# Altium footprint library Package_DFN_QFN.PcbLib: 557 footprints (part 27 of 35)
Each footprint in its own frame and in the unit in brackets; x right, y up, seen from the top. Pads: shape width x height; smd on the part's side, far side on the other; paste and mask are expansions set on the pad; w line width, h text height; cw(c..) or ccw(c..) is an arc to the next point about the centre after c.
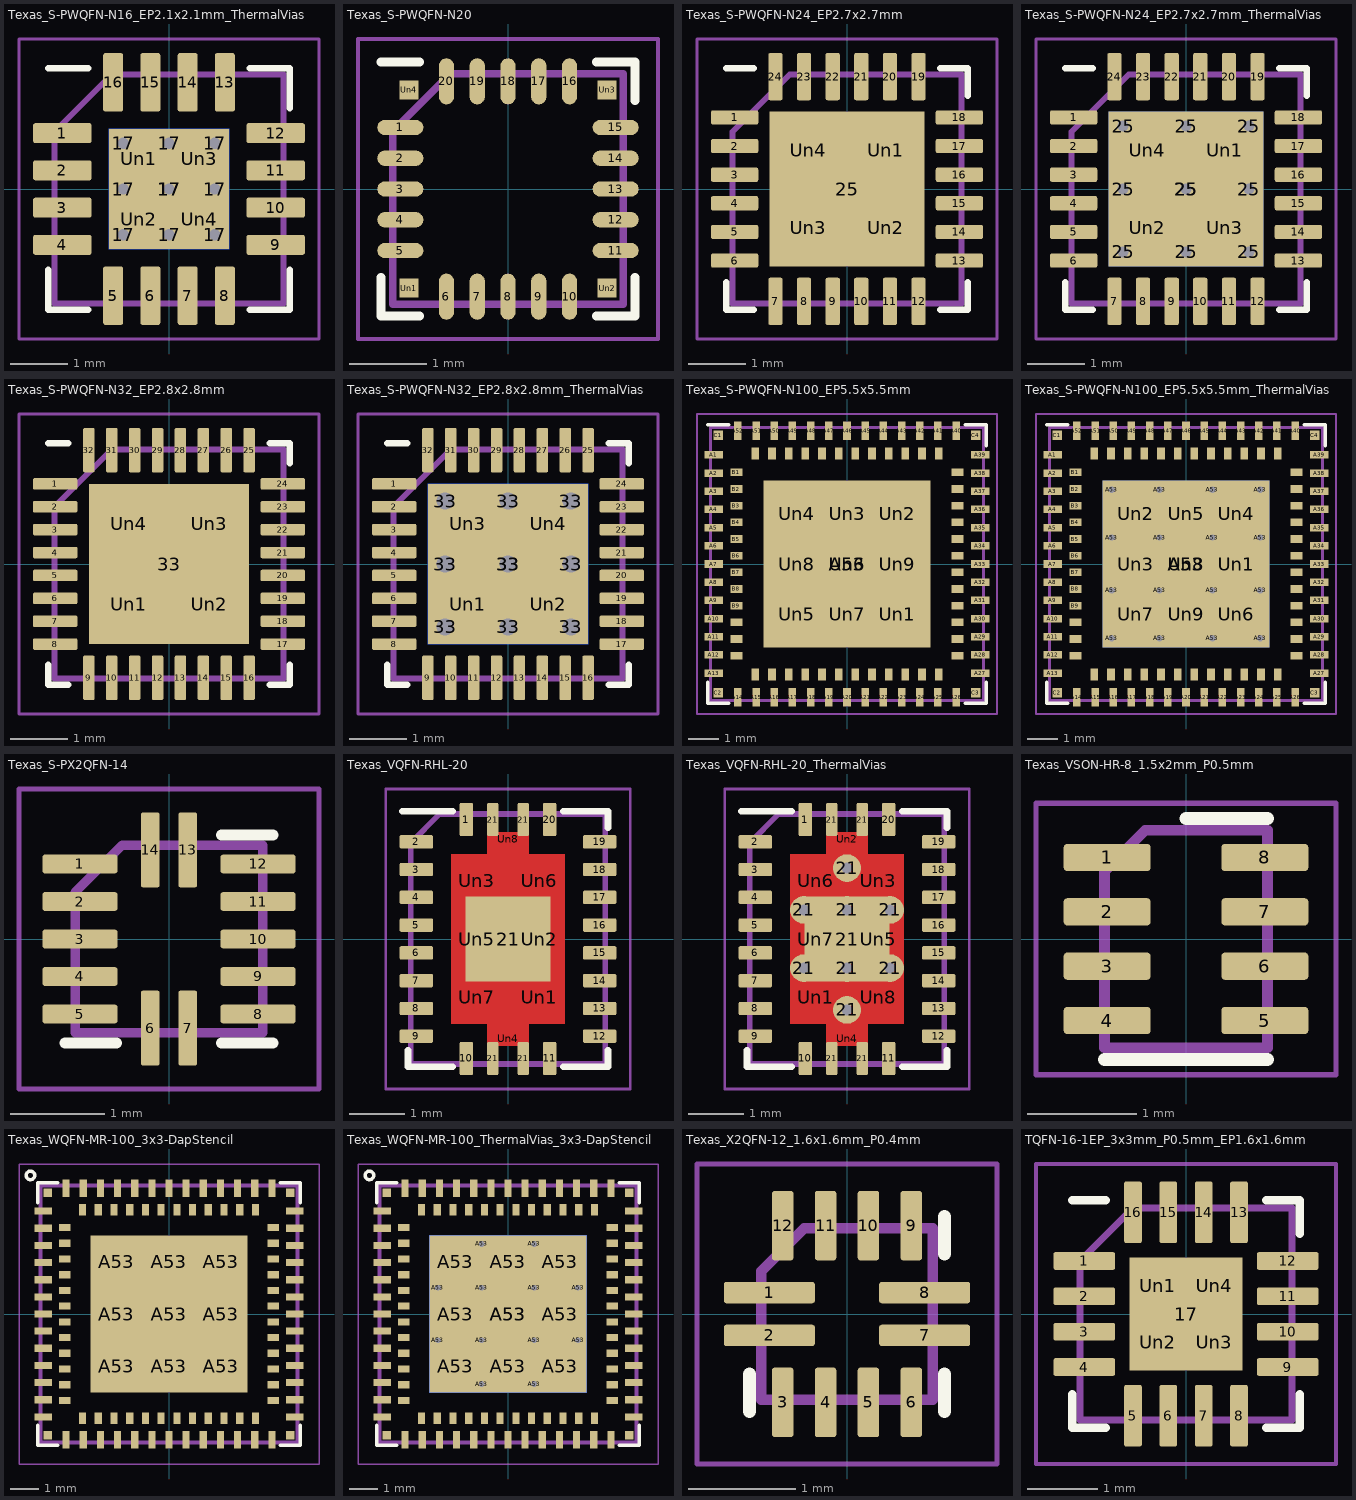
[diagram p26: the footprints below, top view; thin cyan lines are the x and y axes]

## Texas_S-PWQFN-N16_EP2.1x2.1mm_ThermalVias [mm]
pads (31):
  rrect25% 1.025x0.35 smd: 1(-1.863,0.975) 2(-1.863,0.325) 3(-1.863,-0.325) 4(-1.863,-0.975) 9(1.863,-0.975) 10(1.863,-0.325) 11(1.863,0.325) 12(1.863,0.975)
  rrect25% 0.35x1.025 smd: 5(-0.975,-1.863) 6(-0.325,-1.863) 7(0.325,-1.863) 8(0.975,-1.863) 13(0.975,1.863) 14(0.325,1.863) 15(-0.325,1.863) 16(-0.975,1.863)
  round 0.5 hole 0.2: 17(-0.8,-0.8) 17(-0.8,0) 17(-0.8,0.8) 17(0,-0.8) 17(0,0) 17(0,0.8) 17(0.8,-0.8) 17(0.8,0) 17(0.8,0.8)
  rect 2.1x2.1 smd far side: 17(0,0)
  rect 2.1x2.1 smd: 17(0,0)
  rrect25% 0.88x0.88 on Top Paste: Un1(-0.525,0.525) Un2(-0.525,-0.525) Un3(0.525,0.525) Un4(0.525,-0.525)
F.SilkS:
  lines w0.12: -2.11,-1.41 -2.11,-2.11 -1.41,-2.11 ; -2.11,2.11 -1.41,2.11 ; 1.41,-2.11 2.11,-2.11 2.11,-1.41 ; 1.41,2.11 2.11,2.11 2.11,1.41
F.CrtYd:
  lines w0.05: -2.62,-2.62 2.62,-2.62 2.62,2.62 -2.62,2.62 -2.62,-2.62
F.Fab:
  lines w0.1: -2,-2 -2,1 -1,2 2,2 2,-2 -2,-2
  text "'.Designator'" at -4.047,-0.84 h1

## Texas_S-PWQFN-N20 [mm]
pads (24):
  rrect100% 0.6x0.2 smd: 1(-1.4,0.8) 2(-1.4,0.4) 3(-1.4,0) 4(-1.4,-0.4) 5(-1.4,-0.8) 11(1.4,-0.8) 12(1.4,-0.4) 13(1.4,0) 14(1.4,0.4) 15(1.4,0.8)
  rrect100% 0.2x0.6 smd: 6(-0.8,-1.4) 7(-0.4,-1.4) 8(0,-1.4) 9(0.4,-1.4) 10(0.8,-1.4) 16(0.8,1.4) 17(0.4,1.4) 18(0,1.4) 19(-0.4,1.4) 20(-0.8,1.4)
  rect 0.25x0.25 smd: Un1(-1.288,-1.288) Un2(1.288,-1.288) Un3(1.288,1.288) Un4(-1.288,1.288)
F.SilkS:
  lines w0.12: -1.65,-1.15 -1.65,-1.65 -1.15,-1.65 ; -1.65,1.65 -1.15,1.65 ; 1.15,-1.65 1.65,-1.65 1.65,-1.15 ; 1.15,1.65 1.65,1.65 1.65,1.15
F.CrtYd:
  lines w0.05: -1.95,-1.95 -1.95,1.95 1.95,1.95 1.95,-1.95 -1.95,-1.95
F.Fab:
  lines w0.1: -1.5,-1.5 -1.5,0.75 -0.75,1.5 1.5,1.5 1.5,-1.5 -1.5,-1.5
  text "'.Designator'" at -2.023,-0.42 h0.5

## Texas_S-PWQFN-N24_EP2.7x2.7mm [mm]
pads (29):
  rrect25% 0.825x0.25 smd: 1(-1.963,1.25) 2(-1.963,0.75) 3(-1.963,0.25) 4(-1.963,-0.25) 5(-1.963,-0.75) 6(-1.963,-1.25) 13(1.963,-1.25) 14(1.963,-0.75) 15(1.963,-0.25) 16(1.963,0.25) 17(1.963,0.75) 18(1.963,1.25)
  rrect25% 0.25x0.825 smd: 7(-1.25,-1.963) 8(-0.75,-1.963) 9(-0.25,-1.963) 10(0.25,-1.963) 11(0.75,-1.963) 12(1.25,-1.963) 19(1.25,1.963) 20(0.75,1.963) 21(0.25,1.963) 22(-0.25,1.963) 23(-0.75,1.963) 24(-1.25,1.963)
  rect 2.7x2.7 smd: 25(0,0)
  rrect23% 1.09x1.09 on Top Paste: Un1(0.675,0.675) Un2(0.675,-0.675) Un3(-0.675,-0.675) Un4(-0.675,0.675)
F.SilkS:
  lines w0.12: -2.11,-1.635 -2.11,-2.11 -1.635,-2.11 ; -2.11,2.11 -1.635,2.11 ; 1.635,-2.11 2.11,-2.11 2.11,-1.635 ; 1.635,2.11 2.11,2.11 2.11,1.635
F.CrtYd:
  lines w0.05: -2.62,-2.62 2.62,-2.62 2.62,2.62 -2.62,2.62 -2.62,-2.62
F.Fab:
  lines w0.1: -2,-2 -2,1 -1,2 2,2 2,-2 -2,-2
  text "'.Designator'" at -4.047,-0.84 h1

## Texas_S-PWQFN-N24_EP2.7x2.7mm_ThermalVias [mm]
pads (39):
  rrect25% 0.825x0.25 smd: 1(-1.963,1.25) 2(-1.963,0.75) 3(-1.963,0.25) 4(-1.963,-0.25) 5(-1.963,-0.75) 6(-1.963,-1.25) 13(1.963,-1.25) 14(1.963,-0.75) 15(1.963,-0.25) 16(1.963,0.25) 17(1.963,0.75) 18(1.963,1.25)
  rrect25% 0.25x0.825 smd: 7(-1.25,-1.963) 8(-0.75,-1.963) 9(-0.25,-1.963) 10(0.25,-1.963) 11(0.75,-1.963) 12(1.25,-1.963) 19(1.25,1.963) 20(0.75,1.963) 21(0.25,1.963) 22(-0.25,1.963) 23(-0.75,1.963) 24(-1.25,1.963)
  round 0.5 hole 0.2: 25(-1.1,-1.1) 25(-1.1,0) 25(-1.1,1.1) 25(0,-1.1) 25(0,0) 25(0,1.1) 25(1.1,-1.1) 25(1.1,0) 25(1.1,1.1)
  rect 2.7x2.7 smd far side: 25(0,0)
  rect 2.7x2.7 smd: 25(0,0)
  rrect22% 1.13x1.13 on Top Paste: Un1(0.675,0.675) Un2(-0.675,-0.675) Un3(0.675,-0.675) Un4(-0.675,0.675)
F.SilkS:
  lines w0.12: -2.11,-1.635 -2.11,-2.11 -1.635,-2.11 ; -2.11,2.11 -1.635,2.11 ; 1.635,-2.11 2.11,-2.11 2.11,-1.635 ; 1.635,2.11 2.11,2.11 2.11,1.635
F.CrtYd:
  lines w0.05: -2.62,-2.62 2.62,-2.62 2.62,2.62 -2.62,2.62 -2.62,-2.62
F.Fab:
  lines w0.1: -2,-2 -2,1 -1,2 2,2 2,-2 -2,-2
  text "'.Designator'" at -4.047,-0.84 h1

## Texas_S-PWQFN-N32_EP2.8x2.8mm [mm]
pads (37):
  rrect25% 0.775x0.2 smd: 1(-1.987,1.4) 2(-1.987,1) 3(-1.987,0.6) 4(-1.987,0.2) 5(-1.987,-0.2) 6(-1.987,-0.6) 7(-1.987,-1) 8(-1.987,-1.4) 17(1.987,-1.4) 18(1.987,-1) 19(1.987,-0.6) 20(1.987,-0.2) 21(1.987,0.2) 22(1.987,0.6) 23(1.987,1) 24(1.987,1.4)
  rrect25% 0.2x0.775 smd: 9(-1.4,-1.987) 10(-1,-1.987) 11(-0.6,-1.987) 12(-0.2,-1.987) 13(0.2,-1.987) 14(0.6,-1.987) 15(1,-1.987) 16(1.4,-1.987) 25(1.4,1.987) 26(1,1.987) 27(0.6,1.987) 28(0.2,1.987) 29(-0.2,1.987) 30(-0.6,1.987) 31(-1,1.987) 32(-1.4,1.987)
  rect 2.8x2.8 smd: 33(0,0)
  rrect22% 1.13x1.13 on Top Paste: Un1(-0.7,-0.7) Un2(0.7,-0.7) Un3(0.7,0.7) Un4(-0.7,0.7)
F.SilkS:
  lines w0.12: -2.11,-1.76 -2.11,-2.11 -1.76,-2.11 ; -2.11,2.11 -1.76,2.11 ; 1.76,-2.11 2.11,-2.11 2.11,-1.76 ; 1.76,2.11 2.11,2.11 2.11,1.76
F.CrtYd:
  lines w0.05: -2.62,-2.62 -2.62,2.62 2.62,2.62 2.62,-2.62 -2.62,-2.62
F.Fab:
  lines w0.1: -2,-2 2,-2 2,2 -1,2 -2,1 -2,-2
  text "'.Designator'" at -4.047,-0.84 h1

## Texas_S-PWQFN-N32_EP2.8x2.8mm_ThermalVias [mm]
pads (47):
  rrect25% 0.775x0.2 smd: 1(-1.987,1.4) 2(-1.987,1) 3(-1.987,0.6) 4(-1.987,0.2) 5(-1.987,-0.2) 6(-1.987,-0.6) 7(-1.987,-1) 8(-1.987,-1.4) 17(1.987,-1.4) 18(1.987,-1) 19(1.987,-0.6) 20(1.987,-0.2) 21(1.987,0.2) 22(1.987,0.6) 23(1.987,1) 24(1.987,1.4)
  rrect25% 0.2x0.775 smd: 9(-1.4,-1.987) 10(-1,-1.987) 11(-0.6,-1.987) 12(-0.2,-1.987) 13(0.2,-1.987) 14(0.6,-1.987) 15(1,-1.987) 16(1.4,-1.987) 25(1.4,1.987) 26(1,1.987) 27(0.6,1.987) 28(0.2,1.987) 29(-0.2,1.987) 30(-0.6,1.987) 31(-1,1.987) 32(-1.4,1.987)
  round 0.6 hole 0.3: 33(-1.1,-1.1) 33(-1.1,0) 33(-1.1,1.1) 33(0,-1.1) 33(0,0) 33(0,1.1) 33(1.1,-1.1) 33(1.1,0) 33(1.1,1.1)
  rect 2.8x2.8 smd: 33(0,0)
  rect 2.8x2.8 smd far side: 33(0,0)
  rrect21% 1.17x1.17 on Top Paste: Un1(-0.7,-0.7) Un2(0.7,-0.7) Un3(-0.7,0.7) Un4(0.7,0.7)
F.SilkS:
  lines w0.12: -2.11,-1.76 -2.11,-2.11 -1.76,-2.11 ; -2.11,2.11 -1.76,2.11 ; 1.76,-2.11 2.11,-2.11 2.11,-1.76 ; 1.76,2.11 2.11,2.11 2.11,1.76
F.CrtYd:
  lines w0.05: -2.62,-2.62 -2.62,2.62 2.62,2.62 2.62,-2.62 -2.62,-2.62
F.Fab:
  lines w0.1: -2,-2 -2,1 -1,2 2,2 2,-2 -2,-2
  text "'.Designator'" at -4.047,-0.84 h1

## Texas_S-PWQFN-N100_EP5.5x5.5mm [mm]
pads (114):
  rect 0.6x0.25 smd: A1(-4.4,3.6) A2(-4.4,3) A3(-4.4,2.4) A4(-4.4,1.8) A5(-4.4,1.2) A6(-4.4,0.6) A7(-4.4,0) A8(-4.4,-0.6) A9(-4.4,-1.2) A10(-4.4,-1.8) A11(-4.4,-2.4) A12(-4.4,-3) A13(-4.4,-3.6) A27(4.4,-3.6) A28(4.4,-3) A29(4.4,-2.4) A30(4.4,-1.8) A31(4.4,-1.2) A32(4.4,-0.6) A33(4.4,0) A34(4.4,0.6) A35(4.4,1.2) A36(4.4,1.8) A37(4.4,2.4) A38(4.4,3) A39(4.4,3.6)
  rect 0.25x0.6 smd: A14(-3.6,-4.4) A15(-3,-4.4) A16(-2.4,-4.4) A17(-1.8,-4.4) A18(-1.2,-4.4) A19(-0.6,-4.4) A20(0,-4.4) A21(0.6,-4.4) A22(1.2,-4.4) A23(1.8,-4.4) A24(2.4,-4.4) A25(3,-4.4) A26(3.6,-4.4) A40(3.6,4.4) A41(3,4.4) A42(2.4,4.4) A43(1.8,4.4) A44(1.2,4.4) A45(0.6,4.4) A46(0,4.4) A47(-0.6,4.4) A48(-1.2,4.4) A49(-1.8,4.4) A50(-2.4,4.4) A51(-3,4.4) A52(-3.6,4.4)
  rect 5.5x5.5 smd: A53(0,0)
  rect 0.4x0.25 smd: B1(-3.65,3.025) B2(-3.65,2.475) B3(-3.65,1.925) B4(-3.65,1.375) B5(-3.65,0.825) B6(-3.65,0.275) B7(-3.65,-0.275) B8(-3.65,-0.825) B9(-3.65,-1.375) B10(-3.65,-1.925) B11(-3.65,-2.475) B12(-3.65,-3.025) B25(3.65,-3.025) B26(3.65,-2.475) B27(3.65,-1.925) B28(3.65,-1.375) B29(3.65,-0.825) B30(3.65,-0.275) B31(3.65,0.275) B32(3.65,0.825) B33(3.65,1.375) B34(3.65,1.925) B35(3.65,2.475) B36(3.65,3.025)
  rect 0.25x0.4 smd: B13(-3.025,-3.65) B14(-2.475,-3.65) B15(-1.925,-3.65) B16(-1.375,-3.65) B17(-0.825,-3.65) B18(-0.275,-3.65) B19(0.275,-3.65) B20(0.825,-3.65) B21(1.375,-3.65) B22(1.925,-3.65) B23(2.475,-3.65) B24(3.025,-3.65) B37(3.025,3.65) B38(2.475,3.65) B39(1.925,3.65) B40(1.375,3.65) B41(0.825,3.65) B42(0.275,3.65) B43(-0.275,3.65) B44(-0.825,3.65) B45(-1.375,3.65) B46(-1.925,3.65) B47(-2.475,3.65) B48(-3.025,3.65)
  rect 0.3x0.3 smd: C1(-4.25,4.25) C2(-4.25,-4.25) C3(4.25,-4.25) C4(4.25,4.25)
  rect 1.5x1.5 on Top Paste: Un1(1.66,-1.66) Un2(1.66,1.66) Un3(0,1.66) Un4(-1.66,1.66) Un5(-1.66,-1.66) Un6(0,0) Un7(0,-1.66) Un8(-1.66,0) Un9(1.66,0)
F.SilkS:
  lines w0.12: -4.6,-3.9 -4.6,-4.6 -3.9,-4.6 ; -4.6,4.6 -3.9,4.6 ; 3.9,-4.6 4.6,-4.6 4.6,-3.9 ; 3.9,4.6 4.6,4.6 4.6,3.9
F.CrtYd:
  lines w0.05: -4.95,-4.95 -4.95,4.95 4.95,4.95 4.95,-4.95 -4.95,-4.95
F.Fab:
  lines w0.1: -4.5,-4.5 4.5,-4.5 4.5,4.5 -4.5,4.5 -4.5,-4.5
  text "'.Designator'" at -4.047,-0.84 h1

## Texas_S-PWQFN-N100_EP5.5x5.5mm_ThermalVias [mm]
pads (131):
  rect 0.6x0.25 smd: A1(-4.4,3.6) A2(-4.4,3) A3(-4.4,2.4) A4(-4.4,1.8) A5(-4.4,1.2) A6(-4.4,0.6) A7(-4.4,0) A8(-4.4,-0.6) A9(-4.4,-1.2) A10(-4.4,-1.8) A11(-4.4,-2.4) A12(-4.4,-3) A13(-4.4,-3.6) A27(4.4,-3.6) A28(4.4,-3) A29(4.4,-2.4) A30(4.4,-1.8) A31(4.4,-1.2) A32(4.4,-0.6) A33(4.4,0) A34(4.4,0.6) A35(4.4,1.2) A36(4.4,1.8) A37(4.4,2.4) A38(4.4,3) A39(4.4,3.6)
  rect 0.25x0.6 smd: A14(-3.6,-4.4) A15(-3,-4.4) A16(-2.4,-4.4) A17(-1.8,-4.4) A18(-1.2,-4.4) A19(-0.6,-4.4) A20(0,-4.4) A21(0.6,-4.4) A22(1.2,-4.4) A23(1.8,-4.4) A24(2.4,-4.4) A25(3,-4.4) A26(3.6,-4.4) A40(3.6,4.4) A41(3,4.4) A42(2.4,4.4) A43(1.8,4.4) A44(1.2,4.4) A45(0.6,4.4) A46(0,4.4) A47(-0.6,4.4) A48(-1.2,4.4) A49(-1.8,4.4) A50(-2.4,4.4) A51(-3,4.4) A52(-3.6,4.4)
  round 0.5 hole 0.2: A53(-2.45,-2.45) A53(-2.45,-0.87) A53(-2.45,0.87) A53(-2.45,2.45) A53(-0.87,-2.45) A53(-0.87,-0.87) A53(-0.87,0.87) A53(-0.87,2.45) A53(0.87,-2.45) A53(0.87,-0.87) A53(0.87,0.87) A53(0.87,2.45) A53(2.45,-2.45) A53(2.45,-0.87) A53(2.45,0.87) A53(2.45,2.45)
  rect 5.5x5.5 smd: A53(0,0)
  rect 5.5x5.5 smd far side: A53(0,0)
  rect 0.4x0.25 smd: B1(-3.65,3.025) B2(-3.65,2.475) B3(-3.65,1.925) B4(-3.65,1.375) B5(-3.65,0.825) B6(-3.65,0.275) B7(-3.65,-0.275) B8(-3.65,-0.825) B9(-3.65,-1.375) B10(-3.65,-1.925) B11(-3.65,-2.475) B12(-3.65,-3.025) B25(3.65,-3.025) B26(3.65,-2.475) B27(3.65,-1.925) B28(3.65,-1.375) B29(3.65,-0.825) B30(3.65,-0.275) B31(3.65,0.275) B32(3.65,0.825) B33(3.65,1.375) B34(3.65,1.925) B35(3.65,2.475) B36(3.65,3.025)
  rect 0.25x0.4 smd: B13(-3.025,-3.65) B14(-2.475,-3.65) B15(-1.925,-3.65) B16(-1.375,-3.65) B17(-0.825,-3.65) B18(-0.275,-3.65) B19(0.275,-3.65) B20(0.825,-3.65) B21(1.375,-3.65) B22(1.925,-3.65) B23(2.475,-3.65) B24(3.025,-3.65) B37(3.025,3.65) B38(2.475,3.65) B39(1.925,3.65) B40(1.375,3.65) B41(0.825,3.65) B42(0.275,3.65) B43(-0.275,3.65) B44(-0.825,3.65) B45(-1.375,3.65) B46(-1.925,3.65) B47(-2.475,3.65) B48(-3.025,3.65)
  rect 0.3x0.3 smd: C1(-4.25,4.25) C2(-4.25,-4.25) C3(4.25,-4.25) C4(4.25,4.25)
  rect 1.5x1.5 on Top Paste: Un1(1.66,0) Un2(-1.66,1.66) Un3(-1.66,0) Un4(1.66,1.66) Un5(0,1.66) Un6(1.66,-1.66) Un7(-1.66,-1.66) Un8(0,0) Un9(0,-1.66)
F.SilkS:
  lines w0.12: -4.6,-3.9 -4.6,-4.6 -3.9,-4.6 ; -4.6,4.6 -3.9,4.6 ; 3.9,-4.6 4.6,-4.6 4.6,-3.9 ; 3.9,4.6 4.6,4.6 4.6,3.9
F.CrtYd:
  lines w0.05: -4.95,-4.95 -4.95,4.95 4.95,4.95 4.95,-4.95 -4.95,-4.95
F.Fab:
  lines w0.1: -4.5,-4.5 -4.5,4.5 4.5,4.5 4.5,-4.5 -4.5,-4.5
  text "'.Designator'" at -4.047,-0.84 h1

## Texas_S-PX2QFN-14 [mm]
pads (14):
  rrect25% 0.8x0.2 smd: 1(-0.95,0.8) 2(-0.95,0.4) 3(-0.95,0) 4(-0.95,-0.4) 5(-0.95,-0.8) 8(0.95,-0.8) 9(0.95,-0.4) 10(0.95,0) 11(0.95,0.4) 12(0.95,0.8)
  rrect25% 0.2x0.8 smd: 6(-0.2,-0.95) 7(0.2,-0.95) 13(0.2,0.95) 14(-0.2,0.95)
F.SilkS:
  lines w0.12: -1.11,-1.11 -0.56,-1.11 ; 0.56,-1.11 1.11,-1.11 ; 0.56,1.11 1.11,1.11
F.CrtYd:
  lines w0.05: -1.6,-1.6 1.6,-1.6 1.6,1.6 -1.6,1.6 -1.6,-1.6
F.Fab:
  lines w0.1: -1,-1 -1,0.5 -0.5,1 1,1 1,-1 -1,-1
  text "'.Designator'" at -2.028,-0.425 h0.5

## Texas_VQFN-RHL-20 [mm]
pads (33):
  rrect21% 0.24x0.6 smd: 1(-0.75,2.15) 10(-0.75,-2.15) 11(0.75,-2.15) 20(0.75,2.15)
  rrect21% 0.6x0.24 smd: 2(-1.65,1.75) 3(-1.65,1.25) 4(-1.65,0.75) 5(-1.65,0.25) 6(-1.65,-0.25) 7(-1.65,-0.75) 8(-1.65,-1.25) 9(-1.65,-1.75) 12(1.65,-1.75) 13(1.65,-1.25) 14(1.65,-0.75) 15(1.65,-0.25) 16(1.65,0.25) 17(1.65,0.75) 18(1.65,1.25) 19(1.65,1.75)
  rrect25% 0.2x0.6 smd: 21(-0.275,-2.15) 21(-0.275,2.15) 21(0.275,-2.15) 21(0.275,2.15)
  rect 1.524x1.524 smd: 21(0,0)
  rect 0.92x0.85 on Top Paste: Un1(0.56,-1.05) Un2(0.56,0) Un3(-0.56,1.05) Un5(-0.56,0) Un6(0.56,1.05) Un7(-0.56,-1.05)
  rect 0.75x0.25 on Top Paste: Un4(0,-1.8) Un8(0,1.8)
F.Cu:
  region: 0.375,1.525 1.025,1.525 1.025,-1.525 0.375,-1.525 0.375,-1.925 -0.375,-1.925 -0.375,-1.525 -1.025,-1.525 -1.025,1.525 -0.375,1.525 -0.375,1.925 0.375,1.925
F.SilkS:
  lines w0.12: -1.9,2.3 -1,2.3 ; -1.8,-2 -1.8,-2.3 -1,-2.3 ; 1,-2.3 1.8,-2.3 1.8,-2 ; 1,2.3 1.8,2.3 1.8,2
F.Mask:
  region: 0.375,1.525 1.025,1.525 1.025,-1.525 0.375,-1.525 0.375,-1.925 -0.375,-1.925 -0.375,-1.525 -1.025,-1.525 -1.025,1.525 -0.375,1.525 -0.375,1.925 0.375,1.925
F.CrtYd:
  lines w0.05: -2.2,-2.7 2.2,-2.7 2.2,2.7 -2.2,2.7 -2.2,-2.7
F.Fab:
  lines w0.1: -1.75,-2.25 1.75,-2.25 1.75,2.25 -1.23,2.25 -1.75,1.73 -1.75,-2.25
  text "'.Designator'" at -4.047,2.66 h1

## Texas_VQFN-RHL-20_ThermalVias [mm]
pads (41):
  rrect21% 0.24x0.6 smd: 1(-0.75,2.15) 10(-0.75,-2.15) 11(0.75,-2.15) 20(0.75,2.15)
  rrect21% 0.6x0.24 smd: 2(-1.65,1.75) 3(-1.65,1.25) 4(-1.65,0.75) 5(-1.65,0.25) 6(-1.65,-0.25) 7(-1.65,-0.75) 8(-1.65,-1.25) 9(-1.65,-1.75) 12(1.65,-1.75) 13(1.65,-1.25) 14(1.65,-0.75) 15(1.65,-0.25) 16(1.65,0.25) 17(1.65,0.75) 18(1.65,1.25) 19(1.65,1.75)
  round 0.5 hole 0.2: 21(-0.775,-0.525) 21(-0.775,0.525) 21(0,-1.275) 21(0,-0.525) 21(0,0.525) 21(0,1.275) 21(0.775,-0.525) 21(0.775,0.525)
  rrect25% 0.2x0.6 smd: 21(-0.275,-2.15) 21(-0.275,2.15) 21(0.275,-2.15) 21(0.275,2.15)
  rect 1.524x1.524 smd: 21(0,0)
  rect 0.92x0.85 on Top Paste: Un1(-0.56,-1.05) Un3(0.56,1.05) Un5(0.56,0) Un6(-0.56,1.05) Un7(-0.56,0) Un8(0.56,-1.05)
  rect 0.75x0.25 on Top Paste: Un2(0,1.8) Un4(0,-1.8)
F.Cu:
  region: 0.375,1.525 1.025,1.525 1.025,-1.525 0.375,-1.525 0.375,-1.925 -0.375,-1.925 -0.375,-1.525 -1.025,-1.525 -1.025,1.525 -0.375,1.525 -0.375,1.925 0.375,1.925
F.SilkS:
  lines w0.12: -1.9,2.3 -1,2.3 ; -1.8,-2 -1.8,-2.3 -1,-2.3 ; 1,-2.3 1.8,-2.3 1.8,-2 ; 1,2.3 1.8,2.3 1.8,2
F.Mask:
  region: 0.375,1.525 1.025,1.525 1.025,-1.525 0.375,-1.525 0.375,-1.925 -0.375,-1.925 -0.375,-1.525 -1.025,-1.525 -1.025,1.525 -0.375,1.525 -0.375,1.925 0.375,1.925
F.CrtYd:
  lines w0.05: -2.2,-2.7 2.2,-2.7 2.2,2.7 -2.2,2.7 -2.2,-2.7
F.Fab:
  lines w0.1: -1.75,-2.25 1.75,-2.25 1.75,2.25 -1.23,2.25 -1.75,1.73 -1.75,-2.25
  text "'.Designator'" at -4.047,2.66 h1

## Texas_VSON-HR-8_1.5x2mm_P0.5mm [mm]
pads (8):
  rrect25% 0.8x0.25 smd: 1(-0.725,0.75) 2(-0.725,0.25) 3(-0.725,-0.25) 4(-0.725,-0.75) 5(0.725,-0.75) 6(0.725,-0.25) 7(0.725,0.25) 8(0.725,0.75)
F.SilkS:
  lines w0.12: -0.75,-1.11 0.75,-1.11 ; 0,1.11 0.75,1.11
F.CrtYd:
  lines w0.05: -1.38,-1.25 -1.38,1.25 1.38,1.25 1.38,-1.25 -1.38,-1.25
F.Fab:
  lines w0.1: -0.75,-1 -0.75,0.625 -0.375,1 0.75,1 0.75,-1 -0.75,-1
  text "'.Designator'" at -1.541,-0.322 h0.38

## Texas_WQFN-MR-100_3x3-DapStencil [mm]
pads (113):
  rect 0.6x0.25 smd: A1(-4.4,3.6) A2(-4.4,3) A3(-4.4,2.4) A4(-4.4,1.8) A5(-4.4,1.2) A6(-4.4,0.6) A7(-4.4,0) A8(-4.4,-0.6) A9(-4.4,-1.2) A10(-4.4,-1.8) A11(-4.4,-2.4) A12(-4.4,-3) A13(-4.4,-3.6) A27(4.4,-3.6) A28(4.4,-3) A29(4.4,-2.4) A30(4.4,-1.8) A31(4.4,-1.2) A32(4.4,-0.6) A33(4.4,0) A34(4.4,0.6) A35(4.4,1.2) A36(4.4,1.8) A37(4.4,2.4) A38(4.4,3) A39(4.4,3.6)
  rect 0.25x0.6 smd: A14(-3.6,-4.4) A15(-3,-4.4) A16(-2.4,-4.4) A17(-1.8,-4.4) A18(-1.2,-4.4) A19(-0.6,-4.4) A20(0,-4.4) A21(0.6,-4.4) A22(1.2,-4.4) A23(1.8,-4.4) A24(2.4,-4.4) A25(3,-4.4) A26(3.6,-4.4) A40(3.6,4.4) A41(3,4.4) A42(2.4,4.4) A43(1.8,4.4) A44(1.2,4.4) A45(0.6,4.4) A46(0,4.4) A47(-0.6,4.4) A48(-1.2,4.4) A49(-1.8,4.4) A50(-2.4,4.4) A51(-3,4.4) A52(-3.6,4.4)
  rect 1.83x1.83 smd: A53(-1.835,-1.835) A53(-1.835,1.835) A53(1.835,-1.835) A53(1.835,1.835)
  rect 1.83x1.84 smd: A53(-1.835,0) A53(1.835,0)
  rect 1.84x1.83 smd: A53(0,-1.835) A53(0,1.835)
  rect 1.84x1.84 smd: A53(0,0)
  rect 0.4x0.25 smd: B1(-3.65,3.025) B2(-3.65,2.475) B3(-3.65,1.925) B4(-3.65,1.375) B5(-3.65,0.825) B6(-3.65,0.275) B7(-3.65,-0.275) B8(-3.65,-0.825) B9(-3.65,-1.375) B10(-3.65,-1.925) B11(-3.65,-2.475) B12(-3.65,-3.025) B25(3.65,-3.025) B26(3.65,-2.475) B27(3.65,-1.925) B28(3.65,-1.375) B29(3.65,-0.825) B30(3.65,-0.275) B31(3.65,0.275) B32(3.65,0.825) B33(3.65,1.375) B34(3.65,1.925) B35(3.65,2.475) B36(3.65,3.025)
  rect 0.25x0.4 smd: B13(-3.025,-3.65) B14(-2.475,-3.65) B15(-1.925,-3.65) B16(-1.375,-3.65) B17(-0.825,-3.65) B18(-0.275,-3.65) B19(0.275,-3.65) B20(0.825,-3.65) B21(1.375,-3.65) B22(1.925,-3.65) B23(2.475,-3.65) B24(3.025,-3.65) B37(3.025,3.65) B38(2.475,3.65) B39(1.925,3.65) B40(1.375,3.65) B41(0.825,3.65) B42(0.275,3.65) B43(-0.275,3.65) B44(-0.825,3.65) B45(-1.375,3.65) B46(-1.925,3.65) B47(-2.475,3.65) B48(-3.025,3.65)
  rect 0.3x0.3 smd: C1(-4.25,4.25) C2(-4.25,-4.25) C3(4.25,-4.25) C4(4.25,4.25)
F.SilkS:
  circle w0.12: c-4.85,4.85 r0.15
  lines w0.12: -4.6,-3.9 -4.6,-4.6 -3.9,-4.6 ; -4.6,3.9 -4.6,4.6 -3.9,4.6 ; 3.9,-4.6 4.6,-4.6 4.6,-3.9 ; 3.9,4.6 4.6,4.6 4.6,3.9
F.CrtYd:
  lines w0.05: -5.25,-5.25 -5.25,5.25 5.25,5.25 5.25,-5.25 -5.25,-5.25
F.Fab:
  lines w0.15: -4.5,-4.5 4.5,-4.5 4.5,4.5 -4.5,4.5 -4.5,-4.5
  text "'.Designator'" at -4.047,-0.84 h1

## Texas_WQFN-MR-100_ThermalVias_3x3-DapStencil [mm]
pads (126):
  rect 0.6x0.25 smd: A1(-4.4,3.6) A2(-4.4,3) A3(-4.4,2.4) A4(-4.4,1.8) A5(-4.4,1.2) A6(-4.4,0.6) A7(-4.4,0) A8(-4.4,-0.6) A9(-4.4,-1.2) A10(-4.4,-1.8) A11(-4.4,-2.4) A12(-4.4,-3) A13(-4.4,-3.6) A27(4.4,-3.6) A28(4.4,-3) A29(4.4,-2.4) A30(4.4,-1.8) A31(4.4,-1.2) A32(4.4,-0.6) A33(4.4,0) A34(4.4,0.6) A35(4.4,1.2) A36(4.4,1.8) A37(4.4,2.4) A38(4.4,3) A39(4.4,3.6)
  rect 0.25x0.6 smd: A14(-3.6,-4.4) A15(-3,-4.4) A16(-2.4,-4.4) A17(-1.8,-4.4) A18(-1.2,-4.4) A19(-0.6,-4.4) A20(0,-4.4) A21(0.6,-4.4) A22(1.2,-4.4) A23(1.8,-4.4) A24(2.4,-4.4) A25(3,-4.4) A26(3.6,-4.4) A40(3.6,4.4) A41(3,4.4) A42(2.4,4.4) A43(1.8,4.4) A44(1.2,4.4) A45(0.6,4.4) A46(0,4.4) A47(-0.6,4.4) A48(-1.2,4.4) A49(-1.8,4.4) A50(-2.4,4.4) A51(-3,4.4) A52(-3.6,4.4)
  round 0.5 hole 0.2: A53(-2.45,-0.92) A53(-2.45,0.92) A53(-0.92,-2.45) A53(-0.92,-0.92) A53(-0.92,0.92) A53(-0.92,2.45) A53(0.92,-2.45) A53(0.92,-0.92) A53(0.92,0.92) A53(0.92,2.45) A53(2.45,-0.92) A53(2.45,0.92)
  rect 1.83x1.83 smd: A53(-1.835,-1.835) A53(-1.835,1.835) A53(1.835,-1.835) A53(1.835,1.835)
  rect 1.83x1.84 smd: A53(-1.835,0) A53(1.835,0)
  rect 1.84x1.83 smd: A53(0,-1.835) A53(0,1.835)
  rect 5.5x5.5 smd far side: A53(0,0)
  rect 1.84x1.84 smd: A53(0,0)
  rect 0.4x0.25 smd: B1(-3.65,3.025) B2(-3.65,2.475) B3(-3.65,1.925) B4(-3.65,1.375) B5(-3.65,0.825) B6(-3.65,0.275) B7(-3.65,-0.275) B8(-3.65,-0.825) B9(-3.65,-1.375) B10(-3.65,-1.925) B11(-3.65,-2.475) B12(-3.65,-3.025) B25(3.65,-3.025) B26(3.65,-2.475) B27(3.65,-1.925) B28(3.65,-1.375) B29(3.65,-0.825) B30(3.65,-0.275) B31(3.65,0.275) B32(3.65,0.825) B33(3.65,1.375) B34(3.65,1.925) B35(3.65,2.475) B36(3.65,3.025)
  rect 0.25x0.4 smd: B13(-3.025,-3.65) B14(-2.475,-3.65) B15(-1.925,-3.65) B16(-1.375,-3.65) B17(-0.825,-3.65) B18(-0.275,-3.65) B19(0.275,-3.65) B20(0.825,-3.65) B21(1.375,-3.65) B22(1.925,-3.65) B23(2.475,-3.65) B24(3.025,-3.65) B37(3.025,3.65) B38(2.475,3.65) B39(1.925,3.65) B40(1.375,3.65) B41(0.825,3.65) B42(0.275,3.65) B43(-0.275,3.65) B44(-0.825,3.65) B45(-1.375,3.65) B46(-1.925,3.65) B47(-2.475,3.65) B48(-3.025,3.65)
  rect 0.3x0.3 smd: C1(-4.25,4.25) C2(-4.25,-4.25) C3(4.25,-4.25) C4(4.25,4.25)
F.SilkS:
  circle w0.12: c-4.85,4.85 r0.15
  lines w0.12: -4.6,-3.9 -4.6,-4.6 -3.9,-4.6 ; -4.6,3.9 -4.6,4.6 -3.9,4.6 ; 3.9,-4.6 4.6,-4.6 4.6,-3.9 ; 3.9,4.6 4.6,4.6 4.6,3.9
F.CrtYd:
  lines w0.05: -5.25,-5.25 -5.25,5.25 5.25,5.25 5.25,-5.25 -5.25,-5.25
F.Fab:
  lines w0.15: -4.5,-4.5 -4.5,4.5 4.5,4.5 4.5,-4.5 -4.5,-4.5
  text "'.Designator'" at -4.047,-0.84 h1

## Texas_X2QFN-12_1.6x1.6mm_P0.4mm [mm]
pads (12):
  rrect25% 0.85x0.2 smd: 1(-0.725,0.2) 2(-0.725,-0.2) 7(0.725,-0.2) 8(0.725,0.2)
  rrect25% 0.2x0.65 smd: 3(-0.6,-0.825) 4(-0.2,-0.825) 5(0.2,-0.825) 6(0.6,-0.825) 9(0.6,0.825) 10(0.2,0.825) 11(-0.2,0.825) 12(-0.6,0.825)
F.SilkS:
  lines w0.12: -0.91,-0.91 -0.91,-0.56 ; 0.91,-0.91 0.91,-0.56 ; 0.91,0.56 0.91,0.91
F.CrtYd:
  lines w0.05: -1.4,-1.4 -1.4,1.4 1.4,1.4 1.4,-1.4 -1.4,-1.4
F.Fab:
  lines w0.1: -0.8,-0.8 -0.8,0.4 -0.4,0.8 0.8,0.8 0.8,-0.8 -0.8,-0.8
  text "'.Designator'" at -1.619,-0.336 h0.4

## TQFN-16-1EP_3x3mm_P0.5mm_EP1.6x1.6mm [mm]
pads (21):
  rrect25% 0.875x0.25 smd: 1(-1.438,0.75) 2(-1.438,0.25) 3(-1.438,-0.25) 4(-1.438,-0.75) 9(1.438,-0.75) 10(1.438,-0.25) 11(1.438,0.25) 12(1.438,0.75)
  rrect25% 0.25x0.875 smd: 5(-0.75,-1.438) 6(-0.25,-1.438) 7(0.25,-1.438) 8(0.75,-1.438) 13(0.75,1.438) 14(0.25,1.438) 15(-0.25,1.438) 16(-0.75,1.438)
  rect 1.6x1.6 smd: 17(0,0)
  rrect25% 0.64x0.64 on Top Paste: Un1(-0.4,0.4) Un2(-0.4,-0.4) Un3(0.4,-0.4) Un4(0.4,0.4)
F.SilkS:
  lines w0.12: -1.61,-1.135 -1.61,-1.61 -1.135,-1.61 ; -1.61,1.61 -1.135,1.61 ; 1.135,-1.61 1.61,-1.61 1.61,-1.135 ; 1.135,1.61 1.61,1.61 1.61,1.135
F.CrtYd:
  lines w0.05: -2.12,-2.12 2.12,-2.12 2.12,2.12 -2.12,2.12 -2.12,-2.12
F.Fab:
  lines w0.1: -1.5,-1.5 -1.5,0.75 -0.75,1.5 1.5,1.5 1.5,-1.5 -1.5,-1.5
  text "'.Designator'" at -3.033,-0.628 h0.75